# Altium footprint library iv_footprints.PcbLib: 724 footprints (part 40 of 46)
Each footprint in its own frame and in the unit in brackets; x right, y up, seen from the top. Pads: shape width x height; smd on the part's side, far side on the other; paste and mask are expansions set on the pad; w line width, h text height; cw(c..) or ccw(c..) is an arc to the next point about the centre after c.
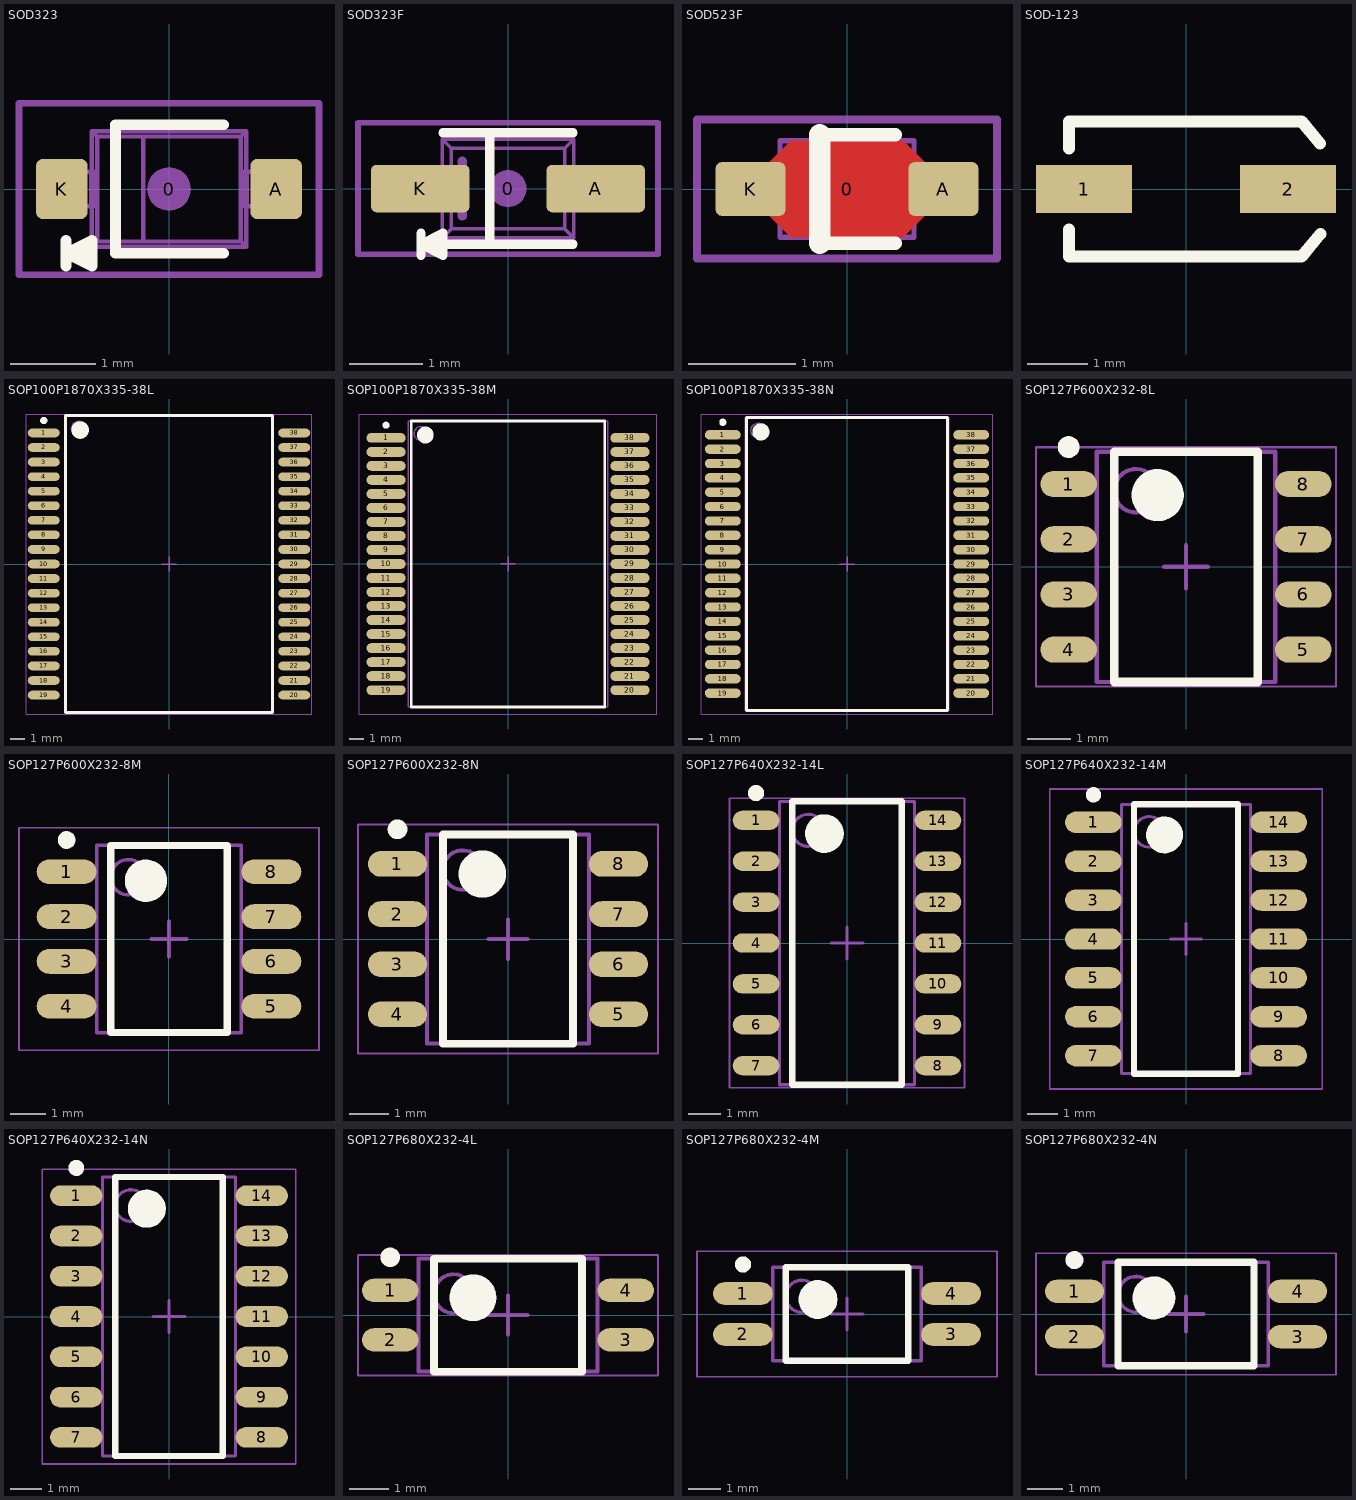
[diagram p39: the footprints below, top view; thin cyan lines are the x and y axes]

## SOD323 [mm] "SOD-323; 2 Leads; Body 1.8 x 1.35 mm, (LxW)"
height 1.15
pads (3):
  round 0.508 on Mech15: 0(0,0)
  rrect25% 0.6x0.7 smd: A(1.25,0) K(-1.25,0)
Top Overlay:
  lines w0.127: -1.2,-0.9 -1.2,-0.6 ; -0.9,-0.75 -1.2,-0.75 ; 0.635,-0.75 -0.625,-0.75 -0.625,0.75 0.635,0.75 ; -1.2,-0.75 -0.9,-0.9 -0.9,-0.6 -1.2,-0.75
Mechanical 13:
  lines w0.05: -1.157,-0.2 -1.157,0.2 ; -1.11,-0.2 -1.11,0.2 ; -0.91,-0.2 -0.91,0.2 ; -0.9,-0.2 -0.9,-0.675 ; -0.9,0.2 -0.9,0.675 ; 0.9,-0.2 0.9,-0.675 ; 0.9,0.2 0.9,0.675 ; 0.91,-0.2 0.91,0.2 ; 1.11,-0.2 1.11,0.2 ; 1.157,-0.2 1.157,0.2 ; -0.9,-0.675 -0.838,-0.613 ; -0.9,-0.675 0.9,-0.675 ; -0.9,0.675 0.9,0.675 ; -0.9,0.675 -0.838,0.613 ; -0.838,-0.613 -0.838,0.613 ; -0.838,-0.613 -0.3,-0.613 ; -0.838,0.613 -0.3,0.613 ; -0.3,-0.613 -0.3,0.613 ; -0.3,-0.613 0.838,-0.613 ; -0.3,0.613 0.838,0.613 ; 0.838,-0.613 0.838,0.613 ; 0.838,-0.613 0.9,-0.675 ; 0.838,0.613 0.9,0.675 ; -1.3,-0.2 -1.3,0.2 -0.879,0.2 -0.879,-0.2 -1.3,-0.2 ; 0.879,-0.2 1.3,-0.2 1.3,0.2 0.879,0.2 0.879,-0.2
Mechanical 15:
  lines w0.076: -1.75,-1 -1.75,1 1.75,1 1.75,-1 -1.75,-1
3D body "SOD323.STEP": height 1.1, standoff 0, extent -1.3,-0.675 1.3,0.675

## SOD323F [mm] "SOD-323; 2 Leads; Body 2.7 x 1.6 mm, (LxW)"
height 1.35
pads (3):
  round 0.508 on Mech15: 0(0,0)
  rrect25% 1.35x0.65 smd: A(1.2,0) K(-1.2,0)
Top Overlay:
  lines w0.127: -1.189,-0.912 -1.189,-0.612 ; -0.889,0.762 0.889,0.762 ; -0.25,-0.762 -0.25,0.762 ; 0.889,-0.762 -0.889,-0.762 -1.189,-0.762 ; -1.189,-0.762 -0.889,-0.612 -0.889,-0.912 -1.189,-0.762
Mechanical 13:
  lines w0.05: -0.9,-0.2 -1.25,-0.2 -1.25,0.2 -0.9,0.2 ; 0.9,-0.2 1.25,-0.2 1.25,0.2 0.9,0.2 ; -0.9,-0.675 0.9,-0.675 ; -0.9,-0.675 -0.9,0.675 ; -0.9,-0.675 -0.776,-0.551 ; -0.9,0.675 0.9,0.675 ; -0.9,0.675 -0.776,0.551 ; -0.776,-0.551 0.776,-0.551 ; -0.776,-0.551 -0.776,0.551 ; -0.776,0.551 0.776,0.551 ; 0.776,-0.551 0.9,-0.675 ; 0.776,-0.551 0.776,0.551 ; 0.776,0.551 0.9,0.675 ; 0.9,-0.675 0.9,0.675
  lines w0.127: -0.625,-0.375 -0.625,0.375
Mechanical 15:
  lines w0.076: -2.05,-0.9 -2.05,0.9 2.05,0.9 2.05,-0.9 -2.05,-0.9
3D body "SOD323F.STEP": height 1, standoff 0, extent -1.25,-0.675 1.25,0.675

## SOD523F [mm] "SOD-523F; 2 Leads; Body 1.3 x 0.9 mm, (LxW)"
height 0.7
pads (3):
  round 0.508 on Mech15: 0(0,0)
  rrect20% 0.65x0.5 smd: A(0.9,0) K(-0.9,0)
Top Layer:
  pour cut-out: -0.725,-0.25 -0.725,0.25 -0.525,0.45 0.525,0.45 0.725,0.25 0.725,-0.25 0.525,-0.45 -0.525,-0.45
Top Overlay:
  lines w0.127: -0.254,-0.508 0.45,-0.508 ; -0.254,0.508 0.45,0.508
  lines w0.2: -0.254,-0.508 -0.254,0.508
  text "." at -0.9,-0.625 h0.05
Mechanical 13:
  lines w0.05: -0.625,-0.175 -0.85,-0.175 -0.85,0.175 -0.625,0.175 ; -0.625,-0.175 -0.625,-0.45 0.625,-0.45 0.625,-0.175 ; -0.625,-0.175 -0.625,0.175 ; -0.625,0.175 -0.625,0.45 0.625,0.45 0.625,0.175 ; 0.625,-0.175 0.85,-0.175 0.85,0.175 0.625,0.175 ; 0.625,-0.175 0.625,0.175
  lines w0.127: -0.425,-0.275 -0.425,0.275
Mechanical 15:
  lines w0.076: -1.4,-0.65 -1.4,0.65 1.4,0.65 1.4,-0.65 -1.4,-0.65
3D body "SOD-523F.STEP": height 0.7, standoff 0, extent -0.85,-0.45 0.85,0.45

## SOD-123 [mm] "SOD-123; 2 Leads; Body 2.7 x 1.6 mm, (LxW)"
height 1.35
pads (2):
  rect 1.6x0.8 smd: 1(-1.7,0) 2(1.7,0)
Top Overlay:
  lines w0.2: -1.95,-0.675 -1.95,-1.125 1.928,-1.125 2.241,-0.747 ; -1.95,0.675 -1.95,1.125 1.928,1.125 2.233,0.756
3D body "SOD-123_DiodesInc.step": height 1.43, standoff -0.02, extent -1.869,-0.862 1.981,0.838

## SOP100P1870X335-38L [mm] "SOP, 38-Leads, Body 20.20x14.00mm, Pitch 1.00mm, IPC High Density"
height 3.35
pads (38):
  oval 2.2x0.6 smd: 1(-8.6,9) 2(-8.6,8) 3(-8.6,7) 4(-8.6,6) 5(-8.6,5) 6(-8.6,4) 7(-8.6,3) 8(-8.6,2) 9(-8.6,1) 10(-8.6,0) 11(-8.6,-1) 12(-8.6,-2) 13(-8.6,-3) 14(-8.6,-4) 15(-8.6,-5) 16(-8.6,-6) 17(-8.6,-7) 18(-8.6,-8) 19(-8.6,-9) 20(8.6,-9) 21(8.6,-8) 22(8.6,-7) 23(8.6,-6) 24(8.6,-5) 25(8.6,-4) 26(8.6,-3) 27(8.6,-2) 28(8.6,-1) 29(8.6,0) 30(8.6,1) 31(8.6,2) 32(8.6,3) 33(8.6,4) 34(8.6,5) 35(8.6,6) 36(8.6,7) 37(8.6,8) 38(8.6,9)
Top Overlay:
  circle w0.25: c-8.6,9.85 r0.125
  circle w0.6: c-6.1,9.2 r0.3
  lines w0.2: -7.1,-10.2 -7.1,10.2 7.1,10.2 7.1,-10.2 -7.1,-10.2
Mechanical 13:
  circle w0.1: c-6.2,9.3 r0.5
  lines w0.1: -7.1,-10.2 -7.1,10.2 7.1,10.2 7.1,-10.2 -7.1,-10.2
Mechanical 15:
  lines w0.05: -9.8,-10.3 -9.8,10.3 9.8,10.3 9.8,-10.3 -9.8,-10.3
  lines w0.1: -0.5,0 0.5,0 ; 0,-0.5 0,0.5
3D body "SOP100P1870X335-38L.step": height 3.35, standoff 0, extent -9.35,-10.2 9.35,10.2

## SOP100P1870X335-38M [mm] "SOP, 38-Leads, Body 20.20x14.00mm, Pitch 1.00mm, IPC Low Density"
height 3.35
pads (38):
  oval 2.8x0.7 smd: 1(-8.7,9) 2(-8.7,8) 3(-8.7,7) 4(-8.7,6) 5(-8.7,5) 6(-8.7,4) 7(-8.7,3) 8(-8.7,2) 9(-8.7,1) 10(-8.7,0) 11(-8.7,-1) 12(-8.7,-2) 13(-8.7,-3) 14(-8.7,-4) 15(-8.7,-5) 16(-8.7,-6) 17(-8.7,-7) 18(-8.7,-8) 19(-8.7,-9) 20(8.7,-9) 21(8.7,-8) 22(8.7,-7) 23(8.7,-6) 24(8.7,-5) 25(8.7,-4) 26(8.7,-3) 27(8.7,-2) 28(8.7,-1) 29(8.7,0) 30(8.7,1) 31(8.7,2) 32(8.7,3) 33(8.7,4) 34(8.7,5) 35(8.7,6) 36(8.7,7) 37(8.7,8) 38(8.7,9)
Top Overlay:
  circle w0.25: c-8.7,9.9 r0.125
  circle w0.6: c-5.9,9.2 r0.3
  lines w0.2: -6.9,-10.2 -6.9,10.2 6.9,10.2 6.9,-10.2 -6.9,-10.2
Mechanical 13:
  circle w0.1: c-6.2,9.3 r0.5
  lines w0.1: -7.1,-10.2 -7.1,10.2 7.1,10.2 7.1,-10.2 -7.1,-10.2
Mechanical 15:
  lines w0.05: -10.6,-10.7 -10.6,10.7 10.6,10.7 10.6,-10.7 -10.6,-10.7
  lines w0.1: -0.5,0 0.5,0 ; 0,-0.5 0,0.5
3D body "SOP100P1870X335-38M.step": height 3.35, standoff 0, extent -9.35,-10.2 9.35,10.2

## SOP100P1870X335-38N [mm] "SOP, 38-Leads, Body 20.20x14.00mm, Pitch 1.00mm, IPC Medium Density"
height 3.35
pads (38):
  oval 2.5x0.65 smd: 1(-8.65,9) 2(-8.65,8) 3(-8.65,7) 4(-8.65,6) 5(-8.65,5) 6(-8.65,4) 7(-8.65,3) 8(-8.65,2) 9(-8.65,1) 10(-8.65,0) 11(-8.65,-1) 12(-8.65,-2) 13(-8.65,-3) 14(-8.65,-4) 15(-8.65,-5) 16(-8.65,-6) 17(-8.65,-7) 18(-8.65,-8) 19(-8.65,-9) 20(8.65,-9) 21(8.65,-8) 22(8.65,-7) 23(8.65,-6) 24(8.65,-5) 25(8.65,-4) 26(8.65,-3) 27(8.65,-2) 28(8.65,-1) 29(8.65,0) 30(8.65,1) 31(8.65,2) 32(8.65,3) 33(8.65,4) 34(8.65,5) 35(8.65,6) 36(8.65,7) 37(8.65,8) 38(8.65,9)
Top Overlay:
  circle w0.25: c-8.65,9.875 r0.125
  circle w0.6: c-6,9.2 r0.3
  lines w0.2: -7,-10.2 -7,10.2 7,10.2 7,-10.2 -7,-10.2
Mechanical 13:
  circle w0.1: c-6.2,9.3 r0.5
  lines w0.1: -7.1,-10.2 -7.1,10.2 7.1,10.2 7.1,-10.2 -7.1,-10.2
Mechanical 15:
  lines w0.05: -10.15,-10.45 -10.15,10.45 10.15,10.45 10.15,-10.45 -10.15,-10.45
  lines w0.1: -0.5,0 0.5,0 ; 0,-0.5 0,0.5
3D body "SOP100P1870X335-38N.step": height 3.35, standoff 0, extent -9.35,-10.2 9.35,10.2

## SOP127P600X232-8L [mm] "SOP, 8-Leads, Body 5.00x3.90mm, Pitch 1.27mm, IPC High Density"
height 2.32
pads (8):
  oval 1.3x0.6 smd: 1(-2.7,1.905) 2(-2.7,0.635) 3(-2.7,-0.635) 4(-2.7,-1.905) 5(2.7,-1.905) 6(2.7,-0.635) 7(2.7,0.635) 8(2.7,1.905)
Top Overlay:
  circle w0.6: c-0.65,1.65 r0.3
  circle w0.25: c-2.7,2.755 r0.125
  lines w0.2: -1.65,-2.65 1.65,-2.65 1.65,2.65 -1.65,2.65 -1.65,-2.65
Mechanical 13:
  circle w0.1: c-1.15,1.75 r0.5
  lines w0.1: -2.05,-2.65 2.05,-2.65 2.05,2.65 -2.05,2.65 -2.05,-2.65
Mechanical 15:
  lines w0.05: -3.45,-2.75 3.45,-2.75 3.45,2.75 -3.45,2.75 -3.45,-2.75
  lines w0.1: -0.5,0 0.5,0 ; 0,-0.5 0,0.5
3D body "SOP127P600X232-8L.step": height 2.32, standoff 0, extent -3,-2.65 3,2.65

## SOP127P600X232-8M [mm] "SOP, 8-Leads, Body 5.00x3.90mm, Pitch 1.27mm, IPC Low Density"
height 2.32
pads (8):
  oval 1.7x0.7 smd: 1(-2.9,1.905) 2(-2.9,0.635) 3(-2.9,-0.635) 4(-2.9,-1.905) 5(2.9,-1.905) 6(2.9,-0.635) 7(2.9,0.635) 8(2.9,1.905)
Top Overlay:
  circle w0.25: c-2.9,2.805 r0.125
  circle w0.6: c-0.65,1.65 r0.3
  lines w0.2: -1.65,-2.65 -1.65,2.65 1.65,2.65 1.65,-2.65 -1.65,-2.65
Mechanical 13:
  circle w0.1: c-1.15,1.75 r0.5
  lines w0.1: -2.05,-2.65 -2.05,2.65 2.05,2.65 2.05,-2.65 -2.05,-2.65
Mechanical 15:
  lines w0.05: -4.25,-3.15 -4.25,3.15 4.25,3.15 4.25,-3.15 -4.25,-3.15
  lines w0.1: -0.5,0 0.5,0 ; 0,-0.5 0,0.5
3D body "SOP127P600X232-8M.step": height 2.32, standoff 0, extent -3,-2.65 3,2.65

## SOP127P600X232-8N [mm] "SOP, 8-Leads, Body 5.00x3.90mm, Pitch 1.27mm, IPC Medium Density"
height 2.32
pads (8):
  oval 1.5x0.65 smd: 1(-2.8,1.905) 2(-2.8,0.635) 3(-2.8,-0.635) 4(-2.8,-1.905) 5(2.8,-1.905) 6(2.8,-0.635) 7(2.8,0.635) 8(2.8,1.905)
Top Overlay:
  circle w0.25: c-2.8,2.78 r0.125
  circle w0.6: c-0.65,1.65 r0.3
  lines w0.2: -1.65,-2.65 -1.65,2.65 1.65,2.65 1.65,-2.65 -1.65,-2.65
Mechanical 13:
  circle w0.1: c-1.15,1.75 r0.5
  lines w0.1: -2.05,-2.65 -2.05,2.65 2.05,2.65 2.05,-2.65 -2.05,-2.65
Mechanical 15:
  lines w0.05: -3.8,-2.9 -3.8,2.9 3.8,2.9 3.8,-2.9 -3.8,-2.9
  lines w0.1: -0.5,0 0.5,0 ; 0,-0.5 0,0.5
3D body "SOP127P600X232-8N.step": height 2.32, standoff 0, extent -3,-2.65 3,2.65

## SOP127P640X232-14L [mm] "SOP, 14-Leads, Body 8.60x3.90mm, Pitch 1.27mm, IPC High Density"
height 2.32
pads (14):
  oval 1.45x0.6 smd: 1(-2.825,3.81) 2(-2.825,2.54) 3(-2.825,1.27) 4(-2.825,0) 5(-2.825,-1.27) 6(-2.825,-2.54) 7(-2.825,-3.81) 8(2.825,-3.81) 9(2.825,-2.54) 10(2.825,-1.27) 11(2.825,0) 12(2.825,1.27) 13(2.825,2.54) 14(2.825,3.81)
Top Overlay:
  circle w0.25: c-2.825,4.66 r0.125
  circle w0.6: c-0.7,3.4 r0.3
  lines w0.2: -1.7,-4.4 -1.7,4.4 1.7,4.4 1.7,-4.4 -1.7,-4.4
Mechanical 13:
  circle w0.1: c-1.2,3.5 r0.5
  lines w0.1: -2.1,-4.4 -2.1,4.4 2.1,4.4 2.1,-4.4 -2.1,-4.4
Mechanical 15:
  lines w0.05: -3.65,-4.5 -3.65,4.5 3.65,4.5 3.65,-4.5 -3.65,-4.5
  lines w0.1: -0.5,0 0.5,0 ; 0,-0.5 0,0.5
3D body "SOP127P640X232-14L.step": height 2.32, standoff 0, extent -3.2,-4.4 3.2,4.4

## SOP127P640X232-14M [mm] "SOP, 14-Leads, Body 8.60x3.90mm, Pitch 1.27mm, IPC Low Density"
height 2.32
pads (14):
  oval 1.85x0.7 smd: 1(-3.025,3.81) 2(-3.025,2.54) 3(-3.025,1.27) 4(-3.025,0) 5(-3.025,-1.27) 6(-3.025,-2.54) 7(-3.025,-3.81) 8(3.025,-3.81) 9(3.025,-2.54) 10(3.025,-1.27) 11(3.025,0) 12(3.025,1.27) 13(3.025,2.54) 14(3.025,3.81)
Top Overlay:
  circle w0.25: c-3.025,4.71 r0.125
  circle w0.6: c-0.7,3.4 r0.3
  lines w0.2: -1.7,-4.4 -1.7,4.4 1.7,4.4 1.7,-4.4 -1.7,-4.4
Mechanical 13:
  circle w0.1: c-1.2,3.5 r0.5
  lines w0.1: -2.1,-4.4 -2.1,4.4 2.1,4.4 2.1,-4.4 -2.1,-4.4
Mechanical 15:
  lines w0.05: -4.45,-4.9 -4.45,4.9 4.45,4.9 4.45,-4.9 -4.45,-4.9
  lines w0.1: -0.5,0 0.5,0 ; 0,-0.5 0,0.5
3D body "SOP127P640X232-14M.step": height 2.32, standoff 0, extent -3.2,-4.4 3.2,4.4

## SOP127P640X232-14N [mm] "SOP, 14-Leads, Body 8.60x3.90mm, Pitch 1.27mm, IPC Medium Density"
height 2.32
pads (14):
  oval 1.65x0.65 smd: 1(-2.925,3.81) 2(-2.925,2.54) 3(-2.925,1.27) 4(-2.925,0) 5(-2.925,-1.27) 6(-2.925,-2.54) 7(-2.925,-3.81) 8(2.925,-3.81) 9(2.925,-2.54) 10(2.925,-1.27) 11(2.925,0) 12(2.925,1.27) 13(2.925,2.54) 14(2.925,3.81)
Top Overlay:
  circle w0.25: c-2.925,4.685 r0.125
  circle w0.6: c-0.7,3.4 r0.3
  lines w0.2: -1.7,-4.4 -1.7,4.4 1.7,4.4 1.7,-4.4 -1.7,-4.4
Mechanical 13:
  circle w0.1: c-1.2,3.5 r0.5
  lines w0.1: -2.1,-4.4 -2.1,4.4 2.1,4.4 2.1,-4.4 -2.1,-4.4
Mechanical 15:
  lines w0.05: -4,-4.65 -4,4.65 4,4.65 4,-4.65 -4,-4.65
  lines w0.1: -0.5,0 0.5,0 ; 0,-0.5 0,0.5
3D body "SOP127P640X232-14N.step": height 2.32, standoff 0, extent -3.2,-4.4 3.2,4.4

## SOP127P680X232-4L [mm] "SOP, 4-Leads, Body 2.60x4.40mm, Pitch 1.27mm, IPC High Density"
height 2.32
pads (4):
  oval 1.45x0.6 smd: 1(-3.025,0.635) 2(-3.025,-0.635) 3(3.025,-0.635) 4(3.025,0.635)
Top Overlay:
  circle w0.25: c-3.025,1.485 r0.125
  circle w0.6: c-0.9,0.45 r0.3
  lines w0.2: -1.9,-1.45 -1.9,1.45 1.9,1.45 1.9,-1.45 -1.9,-1.45
Mechanical 13:
  circle w0.1: c-1.4,0.55 r0.5
  lines w0.1: -2.3,-1.45 -2.3,1.45 2.3,1.45 2.3,-1.45 -2.3,-1.45
Mechanical 15:
  lines w0.05: -3.85,-1.55 -3.85,1.55 3.85,1.55 3.85,-1.55 -3.85,-1.55
  lines w0.1: -0.5,0 0.5,0 ; 0,-0.5 0,0.5
3D body "SOP127P680X232-4L.step": height 2.32, standoff 0, extent -3.375,-1.45 3.375,1.45

## SOP127P680X232-4M [mm] "SOP, 4-Leads, Body 2.60x4.40mm, Pitch 1.27mm, IPC Low Density"
height 2.32
pads (4):
  oval 1.85x0.7 smd: 1(-3.225,0.635) 2(-3.225,-0.635) 3(3.225,-0.635) 4(3.225,0.635)
Top Overlay:
  circle w0.25: c-3.225,1.535 r0.125
  circle w0.6: c-0.9,0.45 r0.3
  lines w0.2: -1.9,-1.45 -1.9,1.45 1.9,1.45 1.9,-1.45 -1.9,-1.45
Mechanical 13:
  circle w0.1: c-1.4,0.55 r0.5
  lines w0.1: -2.3,-1.45 -2.3,1.45 2.3,1.45 2.3,-1.45 -2.3,-1.45
Mechanical 15:
  lines w0.05: -4.65,-1.95 -4.65,1.95 4.65,1.95 4.65,-1.95 -4.65,-1.95
  lines w0.1: -0.5,0 0.5,0 ; 0,-0.5 0,0.5
3D body "SOP127P680X232-4M.step": height 2.32, standoff 0, extent -3.375,-1.45 3.375,1.45

## SOP127P680X232-4N [mm] "SOP, 4-Leads, Body 2.60x4.40mm, Pitch 1.27mm, IPC Medium Density"
height 2.32
pads (4):
  oval 1.65x0.65 smd: 1(-3.125,0.635) 2(-3.125,-0.635) 3(3.125,-0.635) 4(3.125,0.635)
Top Overlay:
  circle w0.25: c-3.125,1.51 r0.125
  circle w0.6: c-0.9,0.45 r0.3
  lines w0.2: -1.9,-1.45 -1.9,1.45 1.9,1.45 1.9,-1.45 -1.9,-1.45
Mechanical 13:
  circle w0.1: c-1.4,0.55 r0.5
  lines w0.1: -2.3,-1.45 -2.3,1.45 2.3,1.45 2.3,-1.45 -2.3,-1.45
Mechanical 15:
  lines w0.05: -4.2,-1.7 -4.2,1.7 4.2,1.7 4.2,-1.7 -4.2,-1.7
  lines w0.1: -0.5,0 0.5,0 ; 0,-0.5 0,0.5
3D body "SOP127P680X232-4N.step": height 2.32, standoff 0, extent -3.375,-1.45 3.375,1.45